# Altium integrated library Integrated_jp.IntLib: 316 symbols (part 2 of 3)
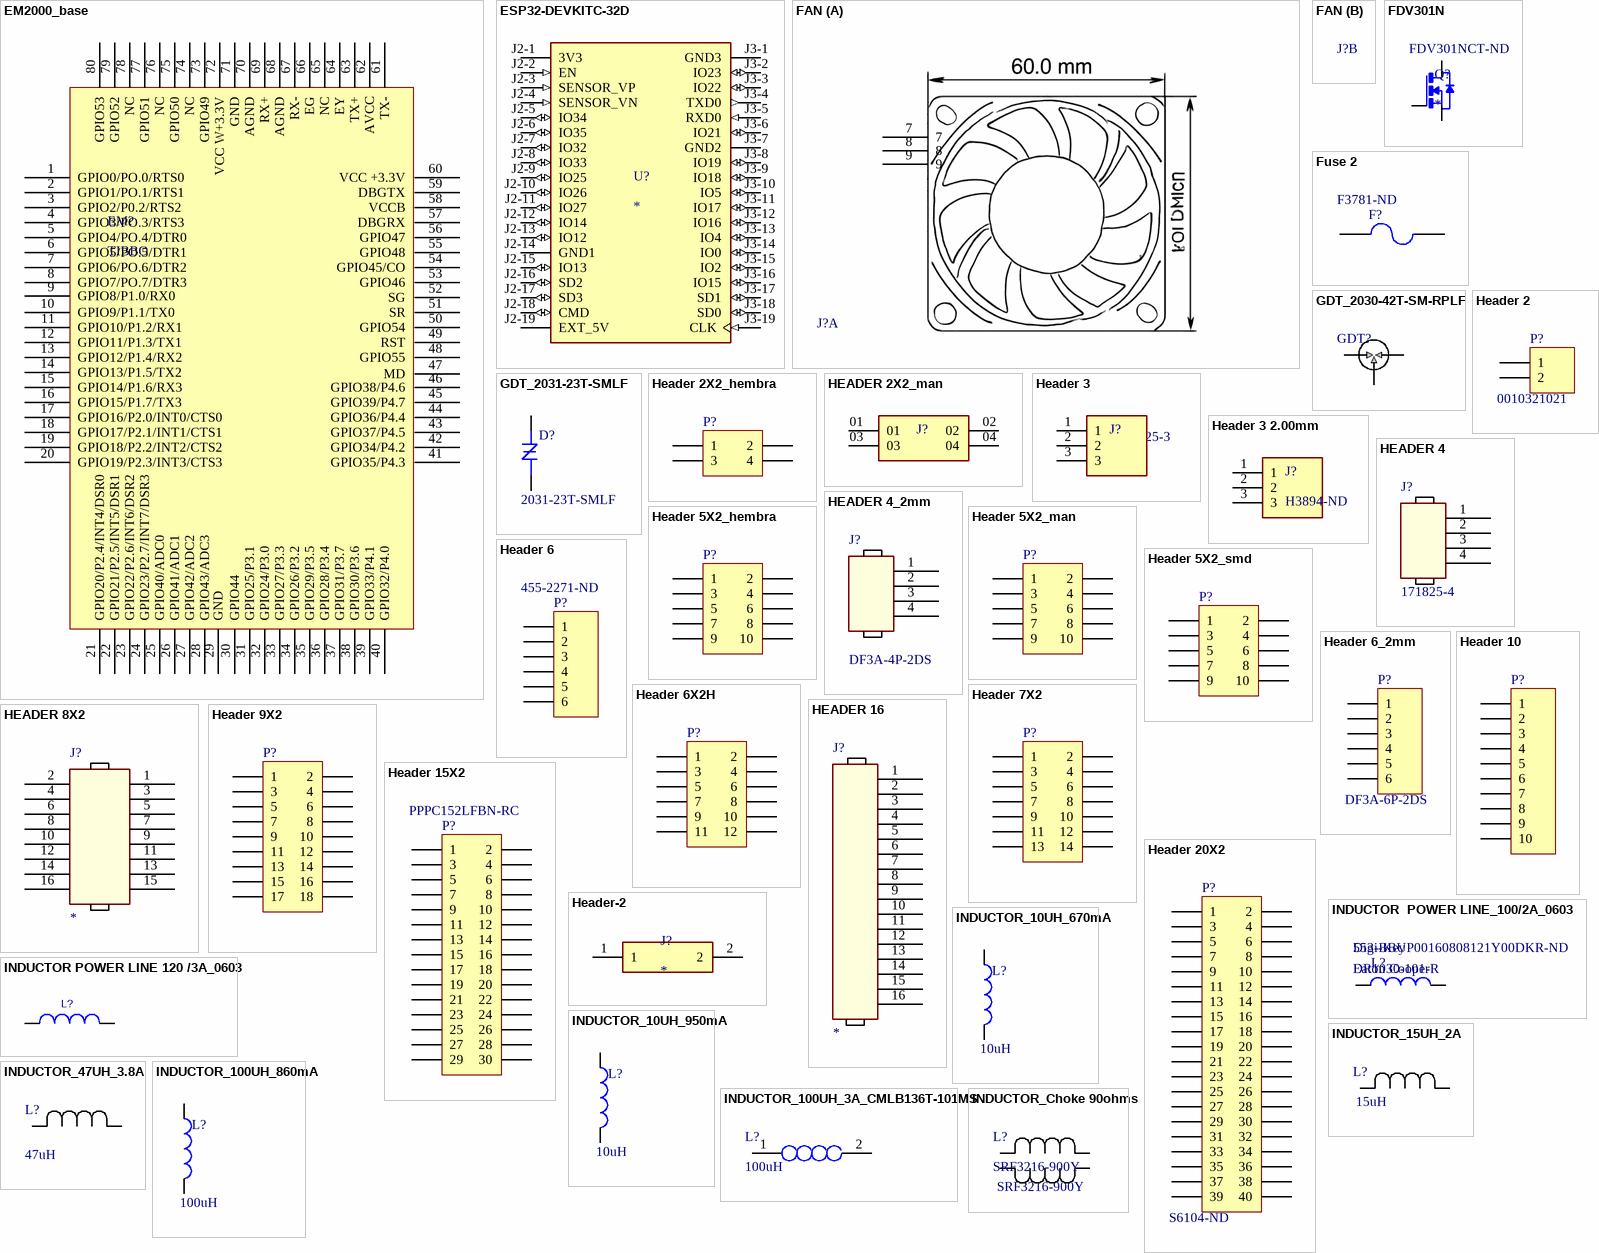
[diagram p11: symbols EM2000_base to INDUCTOR_Choke 90ohms]

## HEADER 4
designator J?, comment 171825-4
Connector Header Through Hole 4 position 0.098" (2.50mm); ComponentLink1Description: CONN HEADER VERT 4POS 2.5MM; ComponentLink1URL: https://www.digikey.com/en/products/detail/te-connectivity-amp-connectors/171825-4/2135511; Link: https://www.digikey.com/en/products/detail/te-connectivity-amp-connectors/171825-4/2135511; Digi_Key_Part_Number: 171825-4; Price: 0,28; Value: 171825-4
footprint CONN_GP904
pins: 1, 2, 3, 4

## HEADER 4_2mm
designator J?, comment DF3A-4P-2DS
Cabezal de conector Orificio pasante, ángulo recto 4 posiciones 0.079" (2.00mm); Digi_Key_Part_Number: H3895-ND; ComponentLink1Description: CONN HEADER R/A 4POS 2MM; ComponentLink1URL: https://www.digikey.com/es/products/detail/hirose-electric-co-ltd/DF3A-4P-2DS/560461; Link: https://www.digikey.com/es/products/detail/hirose-electric-co-ltd/DF3A-4P-2DS/560461; Price JLCPCB: 0.12; Mouser Part: *; LCSC Part: C194925; Price: 0,19; Value: DF3A-4P-2DS
footprint SHDRRA4W60P0X200_1X4_1000X720X530P
pins: 1, 2, 3, 4

## Header 5X2_hembra
designator P?, comment PPTC052LFBN-RC  (value not drawn)
10 Posiciones Cabecera Conector 0.100" (2.54mm) Orificio pasante Estaño; ComponentLink1Description: CONN HDR 10POS 0.1 TIN PCB; ComponentLink1URL: https://www.digikey.com/es/products/detail/PPTC052LFBN-RC/S6105-ND/807243?utm_campaign=buynow&utm_medium=aggregator&curr=usd&utm_source=octopart; Link: https://www.digikey.com/es/products/detail/PPTC052LFBN-RC/S6105-ND/807243?utm_campaign=buynow&utm_medium=aggregator&curr=usd&utm_source=octopart; Digi-Key_Part_Number: S6105-ND; LCSC Part: C22373910; Mouser Part: *; Price JLCPCB: 0,11; Value: PPTC052LFBN-RC; Price: 0,60
signal-integrity model Connector
footprint HDR2X5 (Connector; Header; 5x2 Position)
pins: 1, 2, 3, 4, 5, 6, 7, 8, 9, 10

## Header 5X2_man
designator P?, comment TD-105-T-A  (value not drawn)
10 Posiciones Cabecera Conector Poste Estaño; Link: https://www.digikey.com/es/products/detail/samtec-inc/TD-105-T-A/1105553; Digi-Key_Part_Number: SAM1114-05-ND; Value: TD-105-T-A; Price: 2,15; LCSC Part: C32713278; Mouser Part: *; Price JLCPCB: 0,06; ComponentLink1Description: CONN HEADER VERT 10POS 2.54MM; ComponentLink1URL: https://www.digikey.com/es/products/detail/samtec-inc/TD-105-T-A/1105553
signal-integrity model Connector
footprint HDR2X5 (Connector; Header; 5x2 Position)
pins: 1, 2, 3, 4, 5, 6, 7, 8, 9, 10

## Header 5X2_smd
designator P?, comment GRPB052VWQS-RC  (value not drawn)
Cabezal de conector Montaje en superficie 10 posiciones 0.050" (1.27mm); ComponentLink1Description: GRPB052VWQS-RC; ComponentLink1URL: https://www.digikey.com/es/products/detail/sullins-connector-solutions/GRPB052VWQS-RC/1786414; ComponentLink2Description: CONN HEADER SMD 10POS 1.27MM; ComponentLink2URL: https://www.digikey.com/es/products/detail/GRPB052VWQS-RC/S9012E-05-ND/1786414?utm_campaign=buynow&utm_medium=aggregator&curr=usd&utm_source=octopart; Link: https://www.digikey.com/es/products/detail/GRPB052VWQS-RC/S9012E-05-ND/1786414?utm_campaign=buynow&utm_medium=aggregator&curr=usd&utm_source=octopart; Digi-Key_Part_Number: S9012E-05-ND; Value: GRPB052VWQS-RC; Price: 0,74; LCSC Part: C4943297; Mouser Part: *; Price JLCPCB: 0,08
signal-integrity model Connector
footprint IDC(SMD)-2X5(1.27MM)
pins: 1, 2, 3, 4, 5, 6, 7, 8, 9, 10

## Header 6
designator P?  Supplier Part Number 1: 455-2271-ND
Cabezal de conector Orificio pasante 6 posiciones 0.098" (2.50mm); Manufacturer: JST; Manufacturer Part Number: B6BXHA(LF)(SN); Contact Resistance: 20mR; Current Rating: 3A; Voltage Rating (AC): 250V; Number of Positions: 6; Insulation Resistance: 1GR; Connector Type: Male Pin; Wire/Cable Gauge: 22AWG; Pitch: 2.5mm; LatestRevisionDate: 17-Jul-2002; LatestRevisionNote: Re-released for DXP Platform.; Publisher: Altium Limited; Supplier 1: Digi-Key; Stock 1: 28709; Pricing 1: 1=0.27, 10=0.258, 100=0.1808, 500=0.15494, 1000=0.12912, 5000=0.11068, 10000=0.1033 (USD); Mount: Through Hole; Contact Plating: Tin,Lead,Copper; Contact Material: Brass; Color: Natural; Housing Color: White; Housing Material: Polyamide; Min Operating Temperature: -25°C; Max Operating Temperature: 85°C; Package Quantity: 500; Packaging: Bulk; Termination: Press-Fit; Number of Rows: 1; Voltage Rating: 250V; Max Current Rating: 3A; Number of Contacts: 6; Max Voltage Rating (AC): 250V; Max Voltage Rating (DC): 250V; Orientation: Straight; Length: 17.4mm; Depth: 5.75mm; Lead Pitch: 2.5mm; REACH SVHC: No SVHC; Lead Free: Lead Free; ComponentLink1URL: https://www.verical.com/server-webapp/html/getDatasheet?partID=424647&src-supplier=Verical; ComponentLink1Description: https://www.verical.com/server-webapp/html/getDatasheet?partID=424647&src-supplier=Verical; ComponentLink2URL: http://www.rapidonline.com/pdf/523653.pdf?src-supplier=Rapid+Electronics; ComponentLink2Description: http://www.rapidonline.com/pdf/523653.pdf?src-supplier=Rapid+Electronics; ComponentLink3URL: https://www.verical.com/server-webapp/html/getDatasheet?partID=641012&src-supplier=Verical; ComponentLink3Description: https://www.verical.com/server-webapp/html/getDatasheet?partID=641012&src-supplier=Verical; ComponentLink4URL: http://www1.futureelectronics.com/doc/JST/B6B-XH-A(LF)(SN).pdf?src-supplier=Future+Electronics; ComponentLink4Description: http://www1.futureelectronics.com/doc/JST/B6B-XH-A(LF)(SN).pdf?src-supplier=Future+Electronics; ComponentLink5URL: http://www.jst-mfg.com/product/pdf/eng/eXH.pdf?src-supplier=Digi-Key; ComponentLink5Description: http://www.jst-mfg.com/product/pdf/eng/eXH.pdf?src-supplier=Digi-Key; Digi_Key_Part_Number: 455-2271-ND; Link: https://www.digikey.com/es/products/detail/B6B-XH-A(LF)(SN)/455-2271-ND/1000381?utm_campaign=buynow&utm_medium=aggregator&curr=usd&utm_source=octopart; ComponentLink6Description: CONN HEADER VERT 6POS 2.5MM; ComponentLink6URL: https://www.digikey.com/es/products/detail/B6B-XH-A(LF)(SN)/455-2271-ND/1000381?utm_campaign=buynow&utm_medium=aggregator&curr=usd&utm_source=octopart; ComponentLink7Description: CONN HEADER VERT 6POS 2.5MM; ComponentLink7URL: https://www.digikey.com/es/products/detail/jst-sales-america-inc/B6B-XH-A-LF-SN/1000381
footprint HDR1X6 (Connector; Header; 6 Position)
pins: 1, 2, 3, 4, 5, 6

## Header 6_2mm
designator P?, comment DF3A-6P-2DS
Cabezal de conector Orificio pasante 6 posiciones 0.098" (2.50mm); Digi_Key_Part_Number: H3897-ND; Link: https://www.digikey.com/es/products/detail/hirose-electric-co-ltd/DF3A-6P-2DS/560463; ComponentLink1Description: CONN HEADER R/A 6POS 2MM; ComponentLink1URL: https://www.digikey.com/es/products/detail/hirose-electric-co-ltd/DF3A-6P-2DS/560463; Price: 0,26; LCSC Part: C506720; Mouser Part: *; Price JLCPCB: 0,16; Value: DF3A-6P-2DS
footprint CON6_1X6_R_DF3_HIR
pins: 1, 2, 3, 4, 5, 6

## Header 6X2H
designator P?
Header, 6-Pin, Dual row, Right Angle; LatestRevisionDate: 17-Jul-2002; LatestRevisionNote: Re-released for DXP Platform.; Publisher: Altium Limited
footprint HDR2X6_CEN (Connector; Header; 6x2 Position)
pins: 1, 2, 3, 4, 5, 6, 7, 8, 9, 10, 11, 12

## Header 7X2
designator P?
Header, 7-Pin, Dual row; LatestRevisionDate: 17-Jul-2002; LatestRevisionNote: Re-released for DXP Platform.; Publisher: Altium Limited
signal-integrity model Connector
footprint HDR2X7 (Connector; Header; 7x2 Position)
pins: 1, 2, 3, 4, 5, 6, 7, 8, 9, 10, 11, 12, 13, 14

## HEADER 8X2
designator J?
footprint DISPLAY_BL
pins: 1, 2, 3, 4, 5, 6, 7, 8, 9, 10, 11, 12, 13, 14, 15, 16

## Header 9X2
designator P?
Header, 9-Pin, Dual row; LatestRevisionDate: 17-Jul-2002; LatestRevisionNote: Re-released for DXP Platform.; Publisher: Altium Limited
footprint IDC-2X9
pins: 1, 2, 3, 4, 5, 6, 7, 8, 9, 10, 11, 12, 13, 14, 15, 16, 17, 18

## Header 10
designator P?
10 Position Header Connector 0.079" (2.00mm) Through Hole Gold; Digi_Key_Part_Number: S5751-10-ND; LatestRevisionDate: 17-Jul-2002; LatestRevisionNote: Re-released for DXP Platform.; Publisher: Altium Limited; Link: https://www.digikey.com/en/products/detail/sullins-connector-solutions/NPPN101BFCN-RC/804812; ComponentLink1Description: CONN HDR 10POS 0.079 GOLD PCB; ComponentLink1URL: https://www.digikey.com/es/products/detail/sullins-connector-solutions/NPPN101BFCN-RC/804812?s=N4IgTCBcDaIMoFcA2SCWA7AzgAgMIHt10BTAYwBd8AnbAOQAV7aBGABmYCEAxXWgWgBKuEAF0AvkA
signal-integrity model Connector
footprint RHDR10W55P0X200_1X10_2050X240X440P
pins: 1, 2, 3, 4, 5, 6, 7, 8, 9, 10

## Header 15X2
designator P?, comment PPPC152LFBN-RC
30 Position Header Connector 0.100" (2.54mm) Through Hole GoldCONN HDR 30POS 0.1 GOLD PCB; ComponentLink1Description: CONN HDR 30POS 0.1 GOLD PCB; ComponentLink1URL: https://www.digikey.com/es/products/detail/PPPC152LFBN-RC/S7118-ND/810254?utm_campaign=buynow&utm_medium=aggregator&curr=usd&utm_source=octopart; Digi-Key_Part_Number: S7118-ND; Link: https://www.digikey.com/es/products/detail/PPPC152LFBN-RC/S7118-ND/810254?utm_campaign=buynow&utm_medium=aggregator&curr=usd&utm_source=octopart; Price: 2,28; Value: PPPC152LFBN-RC
footprint HDR2X15 (Connector; Header; 15x2 Position)
signal-integrity model Connector
pins: 1, 2, 3, 4, 5, 6, 7, 8, 9, 10, 11, 12, 13, 14, 15, 16, 17, 18, 19, 20, 21, 22, 23, 24, 25, 26, 27, 28, 29, 30

## HEADER 16
designator J?
pins: 1, 2, 3, 4, 5, 6, 7, 8, 9, 10, 11, 12, 13, 14, 15, 16

## Header 20X2
designator P?, comment S6104-ND
40 Posiciones Cabecera Conector 0.100" (2.54mm) Orificio pasante Estaño; ComponentLink1Description: CONN HDR 40POS 0.1 TIN PCB; ComponentLink1URL: https://www.digikey.com/es/products/detail/sullins-connector-solutions/PPTC202LFBN-RC/807240; Digi_Key_Part_Number: S6104-ND; Link: https://www.digikey.com/es/products/detail/sullins-connector-solutions/PPTC202LFBN-RC/807240; Price: 2,70; Value: S6104-ND
signal-integrity model Connector
footprint HDR2X20 (Connector; Header; 20x2 Position)
pins: 1, 2, 3, 4, 5, 6, 7, 8, 9, 10, 11, 12, 13, 14, 15, 16, 17, 18, 19, 20, 21, 22, 23, 24, 25, 26, 27, 28, 29, 30, 31, 32, 33, 34, 35, 36, 37, 38, 39, 40

## Header-2
designator J?
MP: 3-647295-2; Package: None; Price: None; Value: *; Availability: Unavailable
footprint header-2
pins: 1, 2

## INDUCTOR  POWER LINE_100/2A_0603
designator L?, comment Supplier 1: Digi-Key  Manufacturer: Eaton Cooper  Manufacturer Part Number: DR1030-101-R  Supplier Part Number 1: 553-BBUP00160808121Y00DKR-ND  (hidden comment: 553-BBUP00160808121Y00CT-ND)
100 Ohms @ 100 MHz 1 Línea de alimentación Perlas de ferrita y astillas 0603 (1608 métrico) 2A 35mOhm; Core Material: Ferrite; Current Rating: 860mA; Saturation Current: 1.05A; Tolerance: 30%; Shielding: Shielded; Inductance: 100uH; DC Resistance (DCR): 450mR; Test Frequency: 100kHz; Self Resonant Frequency: 1MHz; Mount: Surface Mount; Case/Package: Nonstandard; Number of Pins: 2; Weight: 0.17637oz; Min Operating Temperature: -40°C; Max Operating Temperature: 125°C; Package Quantity: 1000; Packaging: Tape and Reel; Inductance Tolerance: 30%; Composition: Wirewound; Max DC Current: 1.05A; Termination: SMD/SMT; DC Current: 860mA; Military Standard: Not; RMS Current (Irms): 860mA; Length: 10.5mm; Height: 3mm; Width: 0.405inch; Height - Seated (Max): 0.118inch; Depth: 10.3mm; Radiation Hardening: No; REACH SVHC: Unknown; Lead Free: Lead Free; ComponentLink1Description: Z0603C121APMST; ComponentLink1URL: https://www.digikey.com/es/products/detail/kemet/Z0603C121APMST/13146939; Digi_Key_Part_Number: 553-BBUP00160808121Y00CT-ND; Link: https://www.digikey.com/en/products/detail/pulse-electronics/BBUP00160808121Y00/10508561?s=N4IgTCBcDaIKxwMwFoBCqCqAFADDgjAGw4Acp%2BY%2BAmngMIAqyAcgCIgC6AvkA
footprint IND-0603 (Inductor 0603(1608))
pins: 1, 2

## INDUCTOR POWER LINE 120 /3A_0603
designator L?, comment BLM18BA121SH1D-ND  (value not drawn)
120 Ohms 1 Ferrite Bead 0603 (1608 Metric) 3A 30mOhm; Value: BLM18; Supplier 1: Digi-Key; Supplier Part Number 1: 399-9608-1-ND; Digi_Key_Part_Number: BLM18BA121SH1D-ND; Link: https://www.digikey.com/en/products/detail/murata-electronics/blm18ba121sh1d/2587990; ComponentLink1Description: FERRITE BEAD 120 OHM 0603 1LN; ComponentLink1URL: https://www.digikey.com/es/products/detail/pulse-electronics/BBUP00160808121Y00/10508561?s=N4IgTCBcDaIKxwMwFoBCqCqAFADDgjAGw4Acp%2BY%2BAmngMIAqyAcgCIgC6AvkA
footprint SM/C_0603
pins: 1, 2

## INDUCTOR_10UH_670mA
designator L?, comment value 10uH  (hidden comment: CDRH3D14/HPNP-100NC)
10 µH Shielded Inductor 670 mA 440mOhm Max Nonstandard; Digi_Key_Part_Number: 308-1969-1-ND; Link: https://www.digikey.com/en/products/detail/sumida-america-inc/CDRH3D14-HPNP-100NC/3946967?s=N4IgTCBcDaIMIBEBKAJAzAgjAFgPQoAUA5AgWkwAYKi4QBdAXyA; Price: 0,24; LCSC Part: C212279; Mouser Part: 81-DFE252012F-100MP2; Price JLCPCB: 0,44; ComponentLink1Description: FIXED IND 10UH 670MA 440MOHM SMD; ComponentLink1URL: https://www.digikey.com/en/products/detail/sumida-america-inc/CDRH3D14-HPNP-100NC/3946967?s=N4IgTCBcDaIMIBEBKAJAzAgjAFgPQoAUA5AgWkwAYKi4QBdAXyA
footprint CDRH3D14HPNP100NC
pins: 1, 2

## INDUCTOR_10UH_950mA
designator L?, comment value 10uH  (hidden comment: DFE252012F-100M=P2)
10 µH Shielded Drum Core, Wirewound Inductor 950 mA 480mOhm Max 1008 (2520 Metric) Flat Wire; Digi_Key_Part_Number: 490-13050-1-ND; Link: https://www.digikey.com/en/products/detail/murata-electronics/DFE252012F-100M-P2/5812586; Price: 0,24; LCSC Part: C5832376; ComponentLink1Description: FIXED IND 10UH 950MA 0.48OHM SMD; ComponentLink1URL: https://www.digikey.com/en/products/detail/murata-electronics/DFE252012F-100M-P2/5812586; Mouser Part: 81-DFE252012F-100MP2; Price JLCPCB: 0,03
pins: 1, 2

## INDUCTOR_15UH_2A
designator L?, comment value 15uH  (hidden comment: TYS5040150M-10)
15 µH Blindado Inductivo 2 A 86mOhm máx. No estándar; Digi_Key_Part_Number: 240-2712-1-ND; Link: https://www.digikey.com/es/products/detail/laird-signal-integrity-products/TYS5040150M-10/4733469; Price: 0,41; LCSC Part: C44888; ComponentLink1Description: FIXED IND 15UH 2A 86 MOHM SMD; ComponentLink1URL: https://www.digikey.com/es/products/detail/laird-signal-integrity-products/TYS5040150M-10/4733469; Price JLCPCB: 0,06
footprint INDPM5050X420N
pins: 1, 2

## INDUCTOR_47UH_3.8A
designator L?, comment value 47uH  (hidden comment: SRR1210-470M)
47 µH Shielded Drum Core, Wirewound Inductor 3.8 A 72mOhm Max Nonstandard; Digi_Key_Part_Number: SRR1210-470MCT-ND; ComponentLink1Description: SRR1210-470M; ComponentLink1URL: https://www.digikey.com/en/products/detail/bourns-inc/SRR1210-470M/2562359; Link: https://www.digikey.com/en/products/detail/bourns-inc/SRR1210-470M/2562359; Price: 1,21; JLCPCB Part: C2041371
footprint IND_BOURNS_SRR1210
pins: 1, 2

## INDUCTOR_100UH_3A_CMLB136T-101MS
designator L?, comment value 100uH  (hidden comment: CMLB136T-101MS)
100 µH Shielded Inductor 3 A 198mOhm Max Nonstandard; Digi_Key_Part_Number: 2037-CMLB136T-101MSCT-ND; ComponentLink1Description: FIXED IND 100UH 3A 198 OHM SMD; ComponentLink1URL: https://www.digikey.com/en/products/detail/delta-electronics-cyntec/CMLB136T-101MS/9761303; Link: https://www.digikey.com/en/products/detail/delta-electronics-cyntec/CMLB136T-101MS/9761303; Price: 2,10; LCSC Part: C408533; Mouser Part: 673-BMRF131360101MA1; Price JLCPCB: 0,58
footprint CMLB136T101MS
pins: 1, 2

## INDUCTOR_100UH_860mA
designator L?, comment value 100uH  (hidden comment: 283-DR1030-101-RCT-ND)
100 µH Shielded Drum Core, Wirewound Inductor 860 mA 450mOhm Max Nonstandard; Digi_Key_Part_Number: 308-1969-1-ND; Link: https://www.digikey.com/en/products/detail/sumida-america-inc/CDRH3D14-HPNP-100NC/3946967; ComponentLink1Description: FIXED IND 100UH 860MA 450MOHM SM; ComponentLink1URL: https://www.digikey.com/en/products/detail/sumida-america-inc/CDRH3D14-HPNP-100NC/3946967; Price: 0,56; LCSC Part: C2453945; Mouser Part: 851-CDRH3D14PNP100NC
footprint bobina
pins: 1, 2

## INDUCTOR_Choke 90ohms
designator L?, comment SRF3216-900Y
2 Line Common Mode Choke Surface Mount 90 Ohms @ 100 MHz 400mA DCR 300mOhm; Digi_Key_Part_Number: SRF3216-900YCT-ND; Link: https://www.digikey.com/en/products/detail/bourns-inc/SRF3216-900Y/1969857; ComponentLink1Description: SRF3216-900Y; ComponentLink1URL: https://www.digikey.com/en/products/detail/bourns-inc/SRF3216-900Y/1969857; Price: 0.66; Value: SRF3216-900Y
footprint IND_BOURNS_SRF3216-L
pins: 1, 2, 3, 4

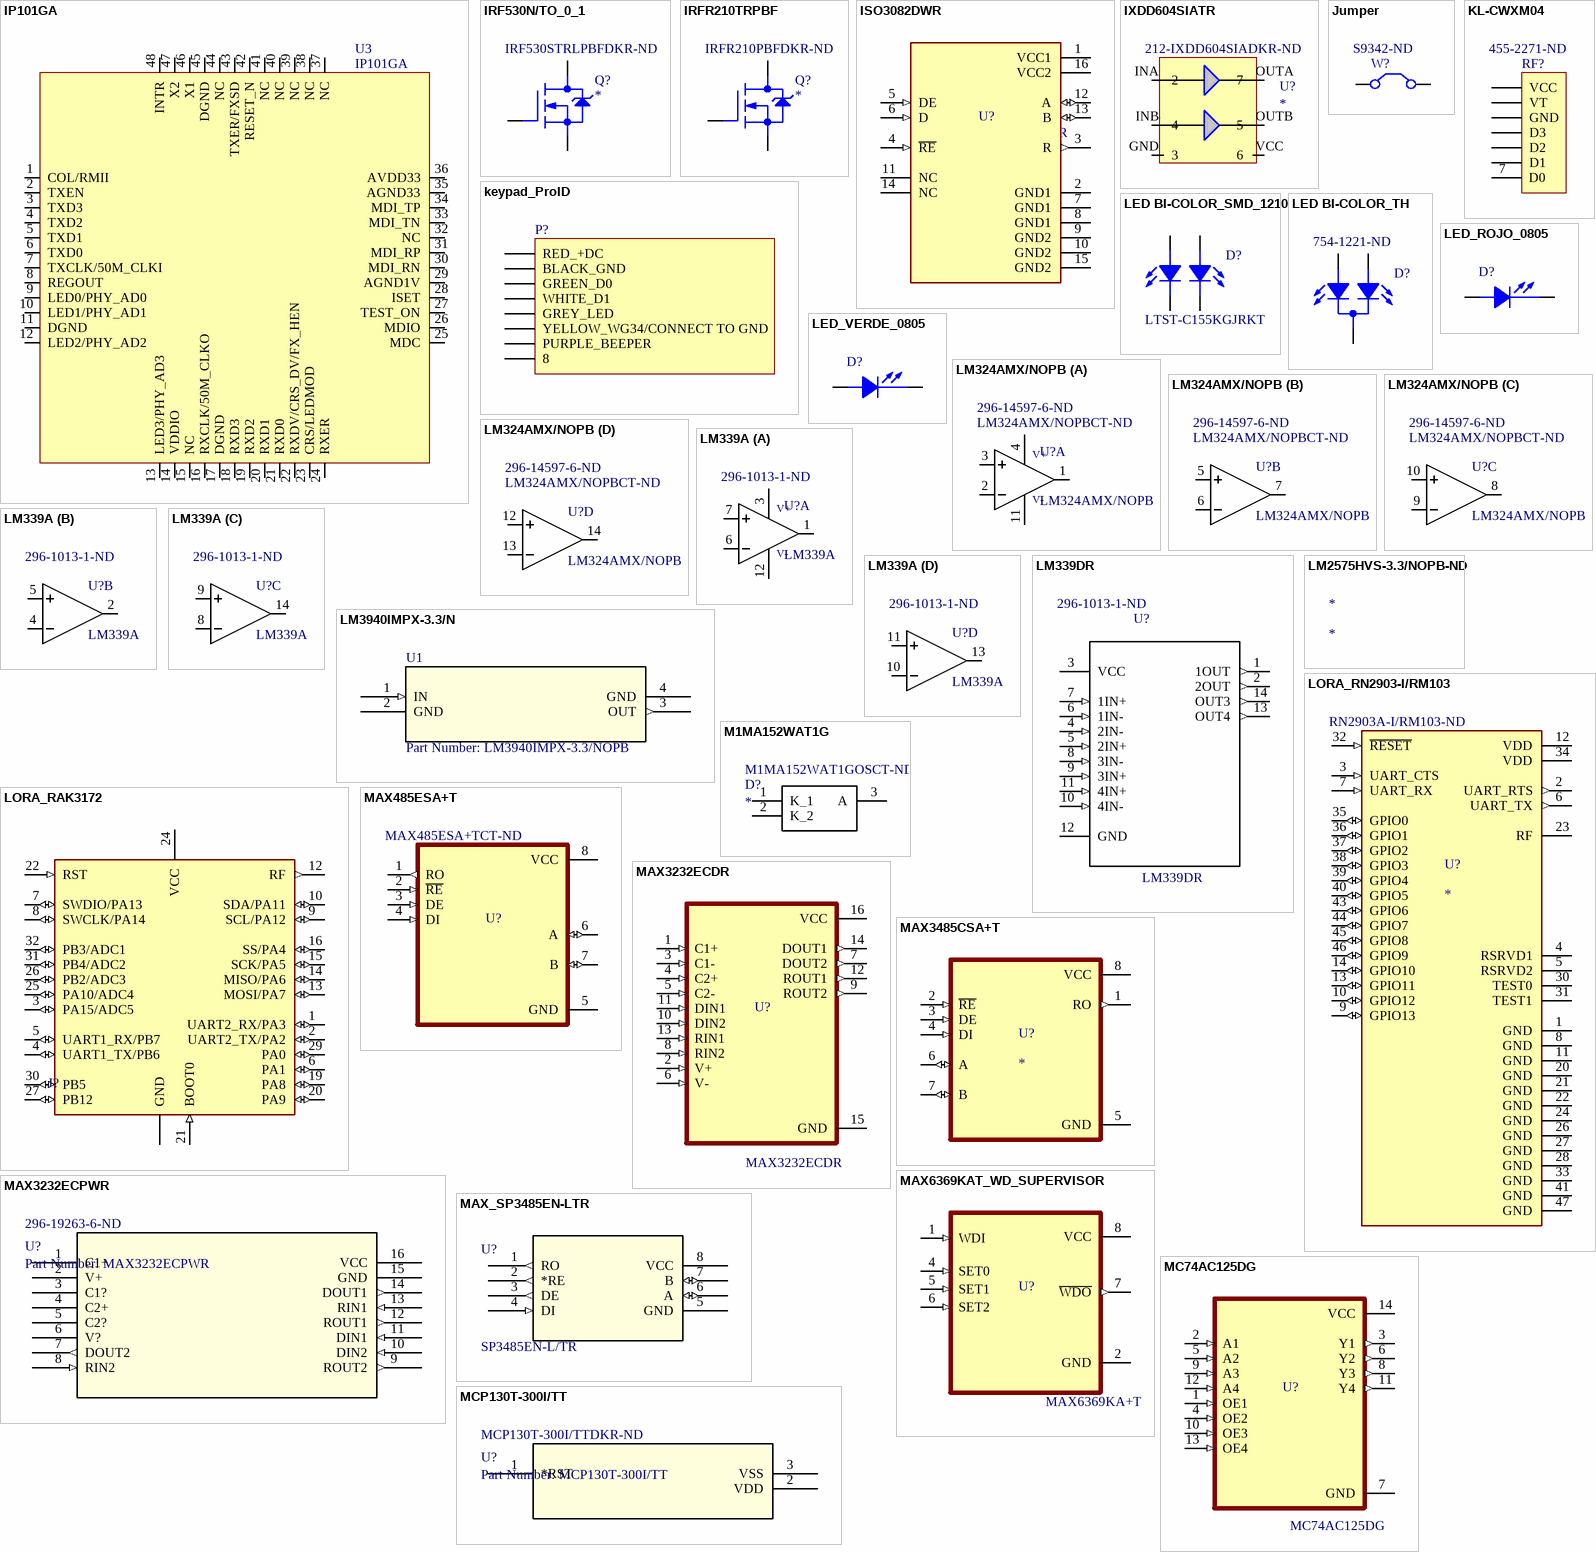
[diagram p5: symbols IP101GA to MCP130T-300I/TT]

## IP101GA
designator U3
Single Port 10/100 MII/RMII/TP/Fiber  Fast Ethernet Transceiver
footprint LQFP48(0.5/9.0)
pins: 1 COL/RMII, 2 TXEN, 3 TXD3, 4 TXD2, 5 TXD1, 6 TXD0, 7 TXCLK/50M_CLKI, 8 REGOUT, 9 LED0/PHY_AD0, 10 LED1/PHY_AD1, 11 DGND, 12 LED2/PHY_AD2, 13 LED3/PHY_AD3, 14 VDDIO, 15 NC, 16 RXCLK/50M_CLKO, 17 DGND, 18 RXD3, 19 RXD2, 20 RXD1, 21 RXD0, 22 RXDV/CRS_DV/FX_HEN, 23 CRS/LEDMOD, 24 RXER, 25 MDC, 26 MDIO, 27 TEST_ON, 28 ISET, 29 AGND1V, 30 MDI_RN, 31 MDI_RP, 32 NC, 33 MDI_TN, 34 MDI_TP, 35 AGND33, 36 AVDD33, 37 NC, 38 NC, 39 NC, 40 NC, 41 NC, 42 RESET_N, 43 TXER/FXSD, 44 NC, 45 DGND, 46 X1, 47 X2, 48 INTR

## IRF530N/TO_0_1
designator Q?  Supplier Part Number 1: IRF530STRLPBFDKR-ND
Canal N Montaje en superficie 100V 14 A (Tc) 3.7W (Ta), 88W (Tc) D2PAK; Manufacturer: Vishay Siliconix; Manufacturer Part Number: IRF530STRLPBF; Rise Time: 34ns; Rds On Max: 160mR; Input Capacitance: 670pF; Nominal Vgs: 2V; Continuous Drain Current (ID): 14A; Gate to Source Voltage (Vgs): 20V; Fall Time: 24ns; Turn-Off Delay Time: 23ns; Turn-On Delay Time: 10ns; Number of Elements: 1; Element Configuration: Single; Supplier 1: Digi-Key; Stock 1: 843; Pricing 1: 1=1.62, 10=1.453, 100=1.0689 (USD); Mount: Surface Mount; Case/Package: TO-263-3; Number of Pins: 3; Weight: 0.068654oz; Min Operating Temperature: -55°C; Max Operating Temperature: 175°C; Packaging: Tape and Reel; Package Quantity: 800; Drain to Source Voltage (Vdss): 100V; Max Power Dissipation: 3.7W; Drain to Source Breakdown Voltage: 100V; Drain to Source Resistance: 160mR; Power Dissipation: 3.7W; Number of Channels: 1; Length: 10.67mm; Height: 4.83mm; Width: 9.65mm; Radiation Hardening: No; REACH SVHC: Unknown; ComponentLink1URL: http://www.vishay.com/docs/91020/sihf530s.pdf?src-supplier=Avnet+Europe; ComponentLink1Description: http://www.vishay.com/docs/91020/sihf530s.pdf?src-supplier=Avnet+Europe; ComponentLink2URL: http://www.mouser.com/ds/2/427/sihf530s-896361.pdf?src-supplier=Mouser; ComponentLink2Description: http://www.mouser.com/ds/2/427/sihf530s-896361.pdf?src-supplier=Mouser; ComponentLink3URL: http://www.vishay.com/docs/91020/sihf530s.pdf?src-supplier=Digi-Key; ComponentLink3Description: http://www.vishay.com/docs/91020/sihf530s.pdf?src-supplier=Digi-Key
footprint TO263 - mosfet
pins: 1, 2, 3

## IRFR210TRPBF
designator Q?  Supplier Part Number 1: IRFR210PBFDKR-ND
Canal N Montaje en superficie 200V 2.6 A (Tc) 2.5W (Ta), 25W (Tc) D-Pak; Manufacturer: Vishay; Manufacturer Part Number: IRFR210TRPBF; Rds On Max: 1.5R; Input Capacitance: 140pF; Rise Time: 17ns; Continuous Drain Current (ID): 2.6A; Gate to Source Voltage (Vgs): 20V; Fall Time: 8.9ns; Turn-Off Delay Time: 14ns; Turn-On Delay Time: 8.2ns; Number of Elements: 1; Element Configuration: Single; Supplier 1: Digi-Key; Stock 1: 584; Pricing 1: 1=0.91, 10=0.81, 100=0.5769, 500=0.48896, 1000=0.39832 (USD); Mount: Surface Mount; Case/Package: DPAK; Number of Pins: 3; Weight: 0.050717oz; Contact Plating: Tin,Matte; Min Operating Temperature: -55°C; Max Operating Temperature: 150°C; Package Quantity: 1; Packaging: Tape and Reel; Drain to Source Voltage (Vdss): 200V; Max Power Dissipation: 2.5W; Drain to Source Breakdown Voltage: 200V; Drain to Source Resistance: 1.5R; Power Dissipation: 2.5W; Number of Channels: 1; On-State Resistance: 1.5R; Length: 6.73mm; Height: 2.39mm; Width: 6.22mm; Radiation Hardening: No; Lead Free: Lead Free; ComponentLink1URL: http://www.mouser.com/ds/2/427/sihfr210-61757.pdf?src-supplier=Mouser; ComponentLink1Description: http://www.mouser.com/ds/2/427/sihfr210-61757.pdf?src-supplier=Mouser; ComponentLink2URL: http://www.vishay.com/docs/91268/sihfr210.pdf?src-supplier=Digi-Key; ComponentLink2Description: http://www.vishay.com/docs/91268/sihfr210.pdf?src-supplier=Digi-Key; ComponentLink3URL: http://www.vishay.com/docs/91268/sihfr210.pdf?src-supplier=Future+Electronics; ComponentLink3Description: http://www.vishay.com/docs/91268/sihfr210.pdf?src-supplier=Future+Electronics
footprint TO252AB/DPAK
pins: 1, 2, 3

## ISO3082DWR
designator U?
200-Kbps, half-duplex, 2.5-kVrms isolated RS-485 & RS-422 transceiver; Digi_Key_Part_Number: 296-37891-1-ND; MF: Texas Instruments; Purchase-URL: https://pricing.snapeda.com/search/part/ISO3082DWR/?ref=eda; Package: SOIC-16 Texas Instruments; SnapEDA_Link: https://www.snapeda.com/parts/ISO3082DWR/Texas+Instruments/view-part/?ref=snap; Check_prices: https://www.snapeda.com/parts/ISO3082DWR/Texas+Instruments/view-part/?ref=eda; Price: 4,63; MP: ISO3082DWR; Availability: In Stock; Supplier 1: Digi-Key; Supplier 2: Digi-Key; Link: https://www.digikey.com/es/products/detail/ISO3082DWR/296-37891-6-ND/4899999?utm_campaign=buynow&utm_medium=aggregator&curr=usd&utm_source=octopart; ComponentLink1Description: ISO RS485/422 0.2MBPS 2.5KVRMS; ComponentLink1URL: https://www.digikey.com/es/products/detail/texas-instruments/ISO3082DWR/1898638; Supplier Part Number 2: 296-37891-1-ND; Supplier Part Number 1: 296-37891-6-ND; Value: ISO3082DWR
footprint SOIC127P1030X265-16N
pins: 1 VCC1 (power), 2 GND1 (power), 3 R (out), 4 ~{RE} (in), 5 DE (in), 6 D (in), 7 GND1 (power), 8 GND1 (power), 9 GND2 (power), 10 GND2 (power), 11 NC, 12 A (io), 13 B (io), 14 NC, 15 GND2 (power), 16 VCC2 (power)

## IXDD604SIATR
designator U?  Supplier Part Number 1: 212-IXDD604SIADKR-ND
Nivel bajo Gate Driver IC No inversor 8-SOIC; Manufacturer: Ixys Clare; Manufacturer Part Number: IXDD604SIATR; Rise Time: 9ns; Max Supply Voltage: 35V; Min Supply Voltage: 4.5V; Output Current: 4A; Number of Outputs: 2; Propagation Delay: 50ns; Fall Time: 8ns; Operating Supply Current: 10uA; Supplier 1: Digi-Key; Stock 1: 2000; Pricing 1: 1=1.76, 10=1.583, 25=1.4936, 100=1.1948, 250=1.04544, 500=1.01558, 1000=0.80649 (USD); Mount: Surface Mount; Case/Package: SOIC; Number of Pins: 8; Weight: 0.019048oz; Min Operating Temperature: -40°C; Max Operating Temperature: 125°C; Packaging: Tape and Reel; Package Quantity: 2000; Max Output Current: 4A; Number of Drivers: 2; Lead Free: Lead Free; ComponentLink1URL: http://www.ixysic.com/home/pdfs.nsf/www/IXD_604.pdf/file/IXD_604.pdf?src-supplier=Digi-Key; ComponentLink1Description: http://www.ixysic.com/home/pdfs.nsf/www/IXD_604.pdf/file/IXD_604.pdf?src-supplier=Digi-Key
footprint *SOIC127P600X134-8N
pins: GND 3 (power), INA 2, INB 4, OUTA 7, OUTB 5, VCC 6 (power)

## Jumper
designator W?, comment S9342-ND
2 (1 x 2) Conector de derivación de posiciones Parte superior abierta 0.100" (2.54mm) Oro; Published: 24-Mar-1999; LatestRevisionDate: 17-Jul-2002; LatestRevisionNote: Re-released for DXP Platform.; PackageReference: RAD-0.2; Publisher: Altium Limited; PackageDescription: Radial Cap, Thru-Hole; 2 Leads; 0.2 in Pin Spacing; Supplier 1: Digi-Key; Link: https://www.digikey.com/es/products/detail/SPC02SXCN-RC/S9342-ND/2618267?utm_campaign=buynow&utm_medium=aggregator&curr=usd&utm_source=octopart; Digi_Key_Part_Number: S9342-ND; ComponentLink1Description: CONN JUMPER SHORTING .100" GOLD; ComponentLink1URL: https://www.digikey.com/es/products/detail/sullins-connector-solutions/SPC02SXCN-RC/2618267?s=N4IgTCBcDaIMoE4DMAWMBaAcgERAXQF8g; Supplier Part Number 1: S9342-ND
footprint RAD-0.2 (Radial Cap, Thru-Hole; 2 Leads; 0.2 in Pin Spacing)
pins: 1 C1, 2 C2

## keypad_ProID
designator P?
Header, 8-Pin; LatestRevisionDate: 17-Jul-2002; LatestRevisionNote: Re-released for DXP Platform.; Publisher: Altium Limited
footprint keypad (Connector; Header; 8 Position)
pins: 1 RED_+DC, 2 BLACK_GND, 3 GREEN_D0, 4 WHITE_D1, 5 GREY_LED, 6 YELLOW_WG34/CONNECT TO GND, 7 PURPLE_BEEPER, 8

## KL-CWXM04
designator RF?  Supplier Part Number 1: 455-2271-ND
RF super heterodyne 315mhz rf wireless transmitter and receiver KL-CWXM04-Pin; Manufacturer: JST; Manufacturer Part Number: B6BXHA(LF)(SN); Contact Resistance: 20mR; Current Rating: 3A; Voltage Rating (AC): 250V; Number of Positions: 6; Insulation Resistance: 1GR; Connector Type: Male Pin; Wire/Cable Gauge: 22AWG; Pitch: 2.5mm; LatestRevisionDate: 17-Jul-2002; LatestRevisionNote: Re-released for DXP Platform.; Publisher: Altium Limited; Supplier 1: Digi-Key; Stock 1: 28709; Pricing 1: 1=0.27, 10=0.258, 100=0.1808, 500=0.15494, 1000=0.12912, 5000=0.11068, 10000=0.1033 (USD); Mount: Through Hole; Contact Plating: Tin,Lead,Copper; Contact Material: Brass; Color: Natural; Housing Color: White; Housing Material: Polyamide; Min Operating Temperature: -25°C; Max Operating Temperature: 85°C; Package Quantity: 500; Packaging: Bulk; Termination: Press-Fit; Number of Rows: 1; Voltage Rating: 250V; Max Current Rating: 3A; Number of Contacts: 6; Max Voltage Rating (AC): 250V; Max Voltage Rating (DC): 250V; Orientation: Straight; Length: 17.4mm; Depth: 5.75mm; Lead Pitch: 2.5mm; REACH SVHC: No SVHC; Lead Free: Lead Free; ComponentLink1URL: https://www.verical.com/server-webapp/html/getDatasheet?partID=424647&src-supplier=Verical; ComponentLink1Description: https://www.verical.com/server-webapp/html/getDatasheet?partID=424647&src-supplier=Verical; ComponentLink2URL: http://www.rapidonline.com/pdf/523653.pdf?src-supplier=Rapid+Electronics; ComponentLink2Description: http://www.rapidonline.com/pdf/523653.pdf?src-supplier=Rapid+Electronics; ComponentLink3URL: https://www.verical.com/server-webapp/html/getDatasheet?partID=641012&src-supplier=Verical; ComponentLink3Description: https://www.verical.com/server-webapp/html/getDatasheet?partID=641012&src-supplier=Verical; ComponentLink4URL: http://www1.futureelectronics.com/doc/JST/B6B-XH-A(LF)(SN).pdf?src-supplier=Future+Electronics; ComponentLink4Description: http://www1.futureelectronics.com/doc/JST/B6B-XH-A(LF)(SN).pdf?src-supplier=Future+Electronics; ComponentLink5URL: http://www.jst-mfg.com/product/pdf/eng/eXH.pdf?src-supplier=Digi-Key; ComponentLink5Description: http://www.jst-mfg.com/product/pdf/eng/eXH.pdf?src-supplier=Digi-Key
footprint HDR1X7 (Connector; Header; 6 Position)
pins: 1 VCC, 2 VT, 3 GND, 4 D3, 5 D2, 6 D1, 7 D0

## LED BI-COLOR_SMD_1210
designator D?, comment value LTST-C155KGJRKT  (hidden comment: 160-1409-1-ND)
Verde, rojo Verde de 571nm, rojo de 631nm Indicación led: discreta Verde de 2V, rojo de 2V 1210 (3225 métrico); Manufacturer: Kingbright; Manufacturer Part Number: WP3VEGW; Color: Green,Red; Lens Color: White; Luminous Intensity: 40mcd; Viewing Angle: 60°; Lens Style: Dome,Diffused,Round; Dominant Wavelength: 625nm; Test Current: 20mA; Mount: Through Hole; Case/Package: Radial; Number of Pins: 1; Min Operating Temperature: -40°C; Max Operating Temperature: 85°C; Package Quantity: 500; Packaging: Bulk; Forward Voltage: 2V; Illumination Color: Green,Red; Height: 5mm; Width: 4mm; Lead Free: Lead Free; Supplier 1: Digi-Key; ComponentLink2Description: LED GREEN/RED CLEAR CHIP SMD; ComponentLink2URL: https://www.digikey.com/es/products/detail/liteon/LTST-C155KGJRKT/386767?s=N4IgTCBcDaIIwDYAMBaOAWJBONKByAIiALoC%2BQA; Digi_Key_Part_Number: 160-1409-1-ND; Link: https://www.digikey.com/es/products/detail/liteon/LTST-C155KGJRKT/386767?s=N4IgTCBcDaIIwDYAMBaOAWJBONKByAIiALoC%2BQA; Supplier Part Number 1: 160-1409-6-ND
footprint LED_LTST-C155GEKT
pins: 1, 2, 3, 4

## LED BI-COLOR_TH
designator D?, comment 754-1221-ND
Verde, rojo Verde de 568nm, rojo de 617nm Indicación led: discreta Verde de 2.2V, rojo de 2V Radial - 3 conductores; Manufacturer: Kingbright; Manufacturer Part Number: WP3VEGW; Color: Green,Red; Lens Color: White; Luminous Intensity: 40mcd; Viewing Angle: 60°; Lens Style: Dome,Diffused,Round; Dominant Wavelength: 625nm; Test Current: 20mA; Supplier 1: Digi-Key; Stock 1: 32286; Pricing 1: 1=0.58, 10=0.417, 100=0.272, 500=0.1955, 1000=0.153, 2500=0.14025, 5000=0.1275, 10000=0.119, 25000=0.11475 (USD); Mount: Through Hole; Case/Package: Radial; Number of Pins: 1; Min Operating Temperature: -40°C; Max Operating Temperature: 85°C; Package Quantity: 500; Packaging: Bulk; Forward Voltage: 2V; Illumination Color: Green,Red; Height: 5mm; Width: 4mm; Lead Free: Lead Free; ComponentLink1Description: LED GREEN/RED DIFFUSED T-1 T/H; ComponentLink1URL: https://www.digikey.com/es/products/detail/kingbright/WP3VEGW/1747620?s=N4IgTCBcDaIOwFYAsBaAjGMaUDkAiIAugL5A; Digi_Key_Part_Number: 754-1221-ND; Link: https://www.digikey.com/es/products/detail/kingbright/WP3VEGW/1747620?s=N4IgTCBcDaIOwFYAsBaAjGMaUDkAiIAugL5A; Supplier Part Number 1: 754-1221-ND
footprint LED BI-COLOUR
pins: 1, 2, 3

## LED_ROJO_0805
designator D?, comment LTST-C171KRKT  (value not drawn)
Rojo 631nm Indicación led: discreta 2V 0805 (2012 métrico); Digi_Key_Part_Number: 160-1427-1-ND; Value: LED RED; Link: https://www.digikey.com/es/products/detail/liteon/LTST-C171KRKT/386801; Price: 0,15; LCSC Part: C284871; Mouser Part: 859-LTST-C171KRKT; Price JLCPCB: 0,02; ComponentLink1Description: LED RED CLEAR SMD 0805; ComponentLink1URL: https://www.digikey.com/es/products/detail/liteon/LTST-C171KRKT/386801
footprint SM/D_0805_21_led
pins: 1, 2

## LED_VERDE_0805
designator D?, comment LTST-C171GKT  (value not drawn)
Verde 569nm Indicación led: discreta 2.1V 0805 (2012 métrico); Digi_Key_Part_Number: 160-1423-1-ND; Value: LED GREEN; Link: https://www.digikey.com/es/products/detail/liteon/LTST-C171GKT/386793; Price: 0,36; LCSC Part: C913075; Mouser Part: 859-LTST-C171GKT; Price JLCPCB: 0,02; ComponentLink1Description: LED GREEN CLEAR CHIP SMD 0805; ComponentLink1URL: https://www.digikey.com/es/products/detail/liteon/LTST-C171GKT/386793
footprint SM/D_0805_21_led - VERDE
pins: 1, 2
